# Altium footprint library Relay.PcbLib: 8 footprints
Each footprint in its own frame and in the unit in brackets; x right, y up, seen from the top. Pads: shape width x height; smd on the part's side, far side on the other; paste and mask are expansions set on the pad; w line width, h text height; cw(c..) or ccw(c..) is an arc to the next point about the centre after c.
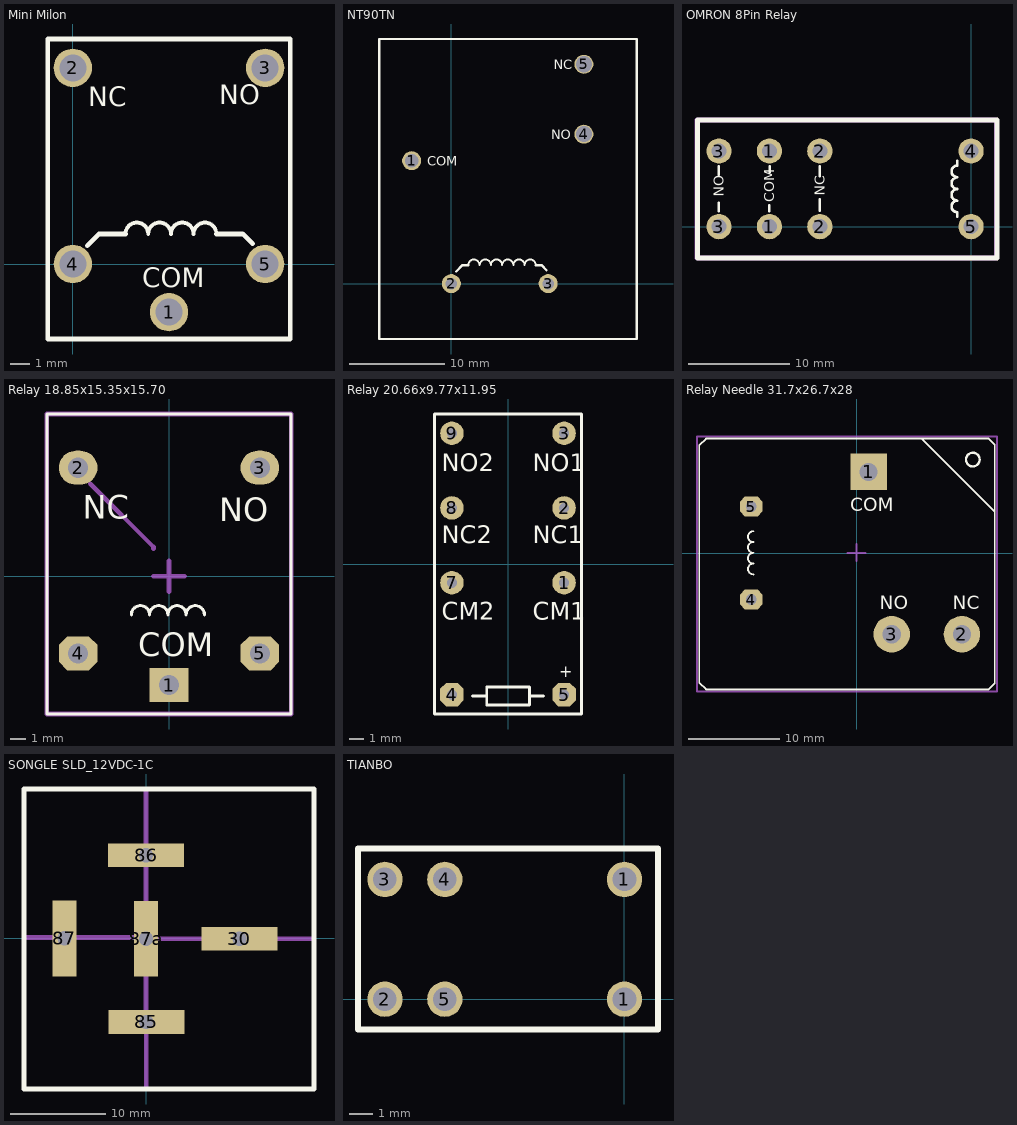
[diagram p0: the footprints below, top view; thin cyan lines are the x and y axes]

## Mini Milon [mm]
pads (5):
  round 2 hole 1.4: 1(5,-2.5) 2(0,10.2) 3(10,10.2) 4(0,0) 5(10,0)
Top Overlay:
  lines w0.2: 2.735,1.565 cw(c3.326,1.565) 3.917,1.565 cw(c4.508,1.565) 5.099,1.565 cw(c5.69,1.565) 6.281,1.565 cw(c6.872,1.565) 7.463,1.565
  lines w0.25: 0.75,0.95 1.365,1.565 2.735,1.565 ; 7.463,1.565 8.835,1.565 9.35,1.05 ; -1.3,-3.9 11.3,-3.9 11.3,11.7 -1.3,11.7 -1.3,-3.9
  text "COM" at 3.6,-1.2 h1
  text "NC" at 0.8,8.2 h1
  text "NO" at 7.6,8.3 h1

## NT90TN [mm]
pads (5):
  round 2 hole 1.4: 1(-4.191,12.954)
  round 2 hole 1.2: 2(0,0) 3(10.2,0)
  round 2 hole 1.7: 4(13.97,15.748) 5(13.97,23.114)
Top Overlay:
  lines w0.2: 1.778,1.946 cw(c2.369,1.946) 2.96,1.946 ; 2.989,1.946 cw(c3.58,1.946) 4.171,1.946 cw(c4.762,1.946) 5.353,1.946 cw(c5.944,1.946) 6.535,1.946 cw(c7.126,1.946) 7.717,1.946 cw(c8.308,1.946) 8.899,1.946
  lines w0.25: 0.508,1.27 1.184,1.946 1.778,1.946 ; 8.899,1.946 9.484,1.946 10.033,1.397 ; -7.62,-5.842 19.558,-5.842 19.558,25.781 -7.62,25.781 -7.62,-5.842
  text "COM" at -2.54,12.446 h1
  text "NC" at 10.795,22.606 h1
  text "NO" at 10.541,15.24 h1
3D body "User Library-Part1-133.SLDPRT": height 27.76, standoff -5.44, extent -7.493,-5.844 19.507,25.656
3D body: height 0.25, standoff 0, extent -0.635,12.446 -0.635,12.446

## OMRON 8Pin Relay [mm]
pads (8):
  round 2.5 hole 1.5: 1(-20,0) 1(-20,7.5) 2(-15,0) 2(-15,7.5) 3(-25,0) 3(-25,7.5) 4(0,7.5) 5(0,0)
Top Overlay:
  lines w0.254: -25.022,1.524 -25.019,2.357 ; -25.022,5.161 -25.019,5.994 ; -19.997,1.524 -19.997,2.109 ; -19.972,5.409 -19.972,5.969 ; -15.022,1.575 -15.022,2.711 ; -15.022,5.011 -15.022,5.994 ; -1.359,0.969 -1.359,1.436 cw(c-1.368,2.01) -1.359,2.584 ; -1.359,2.586 cw(c-1.368,3.16) -1.359,3.734 ; -1.359,3.736 cw(c-1.368,4.31) -1.359,4.884 ; -1.359,4.911 cw(c-1.368,5.485) -1.359,6.059 -1.359,6.525
  lines w0.5: -27.127,-3.099 2.565,-3.099 2.565,10.566 -27.127,10.566 -27.127,-3.099
  text "NC" at -14.522,3.086 h1
  text "NO" at -24.536,2.972 h1
  text "COM" at -19.522,2.409 h1
Mechanical 13:
  lines w0.5: -27.178,-3.099 -27.178,10.566 2.515,10.566 2.515,-3.099 -27.178,-3.099
3D body "User Library-Relais.STEP": height 24.9, standoff -4.3, extent -26.768,-2.766 2.232,10.234

## Relay 18.85x15.35x15.70 [mm] "DESIGNER ABBAS BASEREH"
height 15.7
pads (5):
  rect 2.5x2.2 hole 1.3: 1(0,-7.025)
  oval 2.5x2.2 hole 1.3: 2(-5.875,7.025) 3(5.875,7.025)
  oct 2.5x2.2 hole 1.3: 4(-5.875,-4.975) 5(5.875,-4.975)
Top Overlay:
  lines w0.2: -2.438,-2.48 cw(c-1.847,-2.48) -1.256,-2.48 cw(c-0.665,-2.48) -0.074,-2.48 cw(c0.517,-2.48) 1.108,-2.48 cw(c1.699,-2.48) 2.29,-2.48 ; -7.9,-8.9 7.9,-8.9 7.9,10.5 -7.9,10.5 -7.9,-8.9
  text "NC" at -5.588,3.734 h1.5
  text "NO" at 3.251,3.556 h1.5
  text "COM" at -1.981,-5.182 h1.5
Mechanical 15:
  lines w0.3: -5.1,6 -1,1.9 -1,1.8 ; -1,0 1,0 ; 0,-1 0,1 ; -7.9,-8.9 7.9,-8.9 7.9,10.5 -7.9,10.5 -7.9,-8.9
3D body "User Library-Relay SPDT.STEP": height 15.6, standoff -3.8, extent -7.75,-8.7 7.75,10.3

## Relay 20.66x9.77x11.95 [mm]
height 11.95
pads (8):
  round 1.6 hole 0.7: 1(3.81,-1.27) 2(3.81,3.81) 3(3.81,8.89) 7(-3.81,-1.27) 8(-3.81,3.81) 9(-3.81,8.89)
  oct 1.6x1.6 hole 0.7: 4(-3.81,-8.89) 5(3.81,-8.89)
Top Overlay:
  lines w0.2: -2.4,-8.98 -1.447,-8.98 ; 1.472,-8.98 2.4,-8.98 ; -5,-10.2 -5,10.2 5,10.2 5,-10.2 -5,-10.2 ; -1.447,-9.59 -1.447,-8.371 1.472,-8.371 1.472,-9.59 -1.447,-9.59
  text "+" at 3.5,-7.7 h0.8
  text "CM1" at 1.7,-3.8 h1.2
  text "NC1" at 1.7,1.4 h1.2
  text "NO1" at 1.7,6.3 h1.2
  text "NO2" at -4.5,6.3 h1.2
  text "NC2" at -4.5,1.4 h1.2
  text "CM2" at -4.5,-3.8 h1.2
3D body "OMROM G5V-2 DPDT Mini Relay -TH.STEP": height 11, standoff -3.7, extent -4.925,-10.1 4.925,10.1

## Relay Needle 31.7x26.7x28 [mm] "DESIGNER ABBAS BASEREH"
height 28
pads (5):
  rect 4x4 hole 2: 1(1.31,8.9)
  round 4 hole 2: 2(11.55,-8.9) 3(3.85,-8.9)
  oct 2.5x2.2 hole 1.2: 4(-11.55,-5.1) 5(-11.55,5.1)
Top Overlay:
  circle w0.254: c12.75,10.25 r0.75
  lines w0.2: -11.32,-2.338 cw(c-11.32,-1.747) -11.32,-1.156 cw(c-11.32,-0.565) -11.32,0.026 cw(c-11.32,0.617) -11.32,1.208 cw(c-11.32,1.799) -11.32,2.39 ; 7.15,12.55 15.15,4.55 ; -17.25,-14.2 -16.5,-14.95 14.5,-14.95 15.15,-14.3 15.15,11.9 14.5,12.55 -16.5,12.55 -17.25,11.8 -17.25,-14.2
  text "COM" at -0.7,4.6 h1.5
  text "NO" at 2.55,-6.15 h1.5
  text "NC" at 10.55,-6.15 h1.5
Mechanical 15:
  lines w0.2: -1,0 1,0 ; 0,-0.9 0,1 ; -17.5,-15.2 15.4,-15.2 15.4,12.8 -17.5,12.8 -17.5,-15.2
3D body "AZ2100_1C-XXXX_POWER RELAY.SLDPRT": height 28.04, standoff -3.46, extent -17.179,-14.932 15.079,12.5

## SONGLE SLD_12VDC-1C [mm] "Relay SONGLE SLD_12VDC-1C"
pads (5):
  rect 8x2.5 hole 1.5 square: 30(9.83,-0.076) 85(0.025,-8.839) 86(0,8.712)
  rect 2.5x8 hole 1.5 square: 87(-8.594,-0.025) 87a(0,-0.076)
Top Overlay:
  lines w0.5: -12.852,-15.9 17.678,-15.9 17.678,15.697 -12.852,15.697 -12.852,-15.9
Mechanical 15:
  lines w0.5: -12.827,0.051 0,0.051 ; 0,-0.406 0,15.646 ; 0,-0.081 0,-9.195 0.025,-9.22 0.025,-15.875 ; 0,-0.076 17.45,-0.076

## TIANBO [mm] "TIANBO Reaky TR5V L-S-Z"
height 10
pads (6):
  round 1.5 hole 1: 1(0,0) 1(0,5.08) 2(-10.16,0) 3(-10.16,5.08) 4(-7.62,5.08) 5(-7.62,0)
Top Overlay:
  lines w0.254: -11.303,-1.295 1.422,-1.295 1.422,6.401 -11.303,6.401 -11.303,-1.295
3D body "User Library-TR5V L-S-Z.STEP": height 10, standoff -3.5, extent -11.15,-1.14 1.25,6.26